# Altium schematic symbol library IC_Maxim.SchLib: 843 symbols (part 19 of 20)
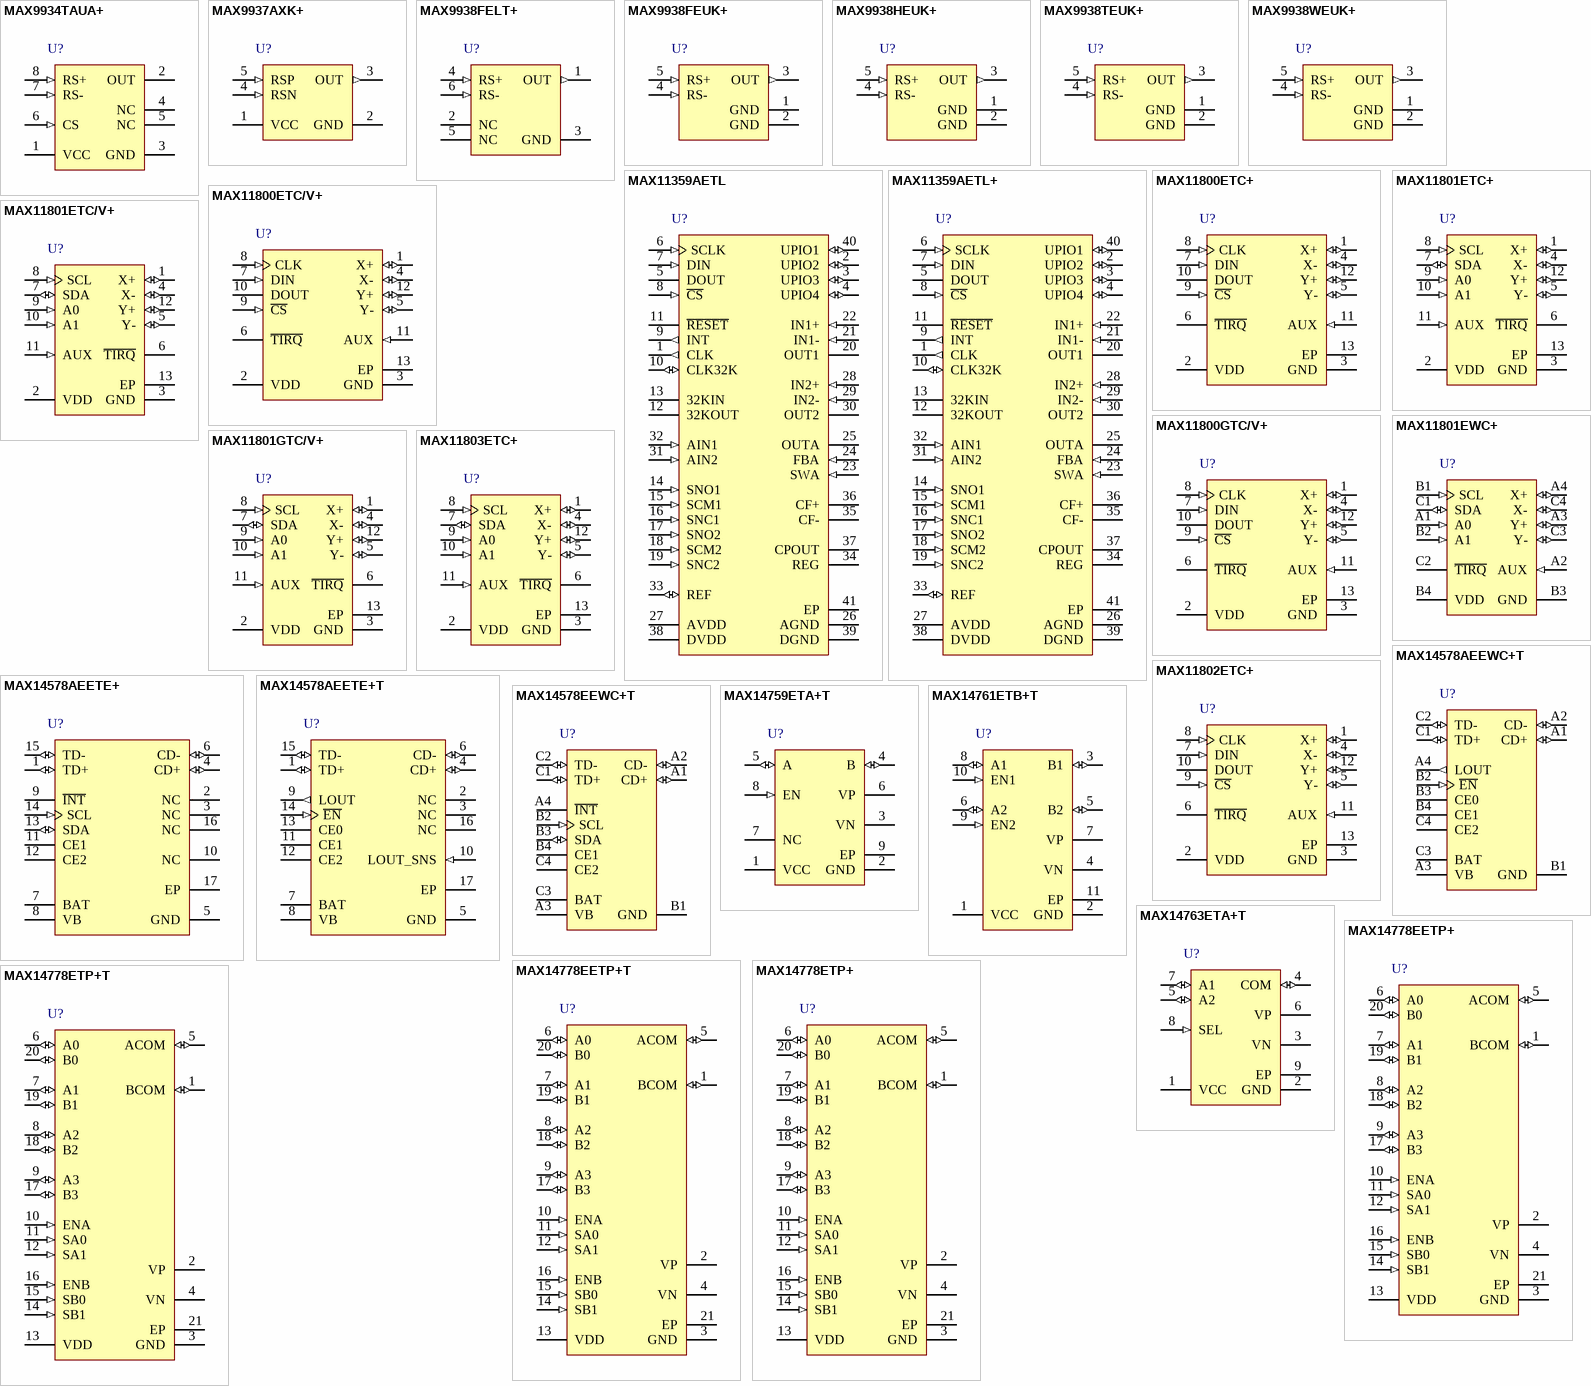
[diagram p42: symbols MAX9934TAUA+ to MAX14778ETP+T]

## MAX11801EWC+
designator U?
4 Channels, Ultra-Small, Low-Power, 4-Wire Touch-Sensor Controller with I2C Interface, -40 to 85 degC, 12-Pin BGA (W121A2+1), Pb-Free; Generic Part Number: MAX11801; PartNumber: MAX11801EWC+; Channels: 4; Controller Type: Resistive; EV Kit: Yes; DatasheetVersion: Rev. 3; PackageVersion: Rev. G, 02/2010; PackageReference: W121A2+1; PackageDescription: 12-Pin Wafer-Level Package, Full Array, Body 1.555 x 2.135 mm, Pitch 0.5 mm; Interface: I2C; Mounting Technology: Surface Mount; ComponentLink1Description: Manufacturer URL; ComponentLink1URL: http://www.maximintegrated.com/; ComponentLink2Description: Datasheet; ComponentLink2URL: http://datasheets.maximintegrated.com/en/ds/MAX11800-MAX11803.pdf; ComponentLink3Description: Package Specification; ComponentLink3URL: http://pdfserv.maximintegrated.com/package_dwgs/21-0009.PDF
footprint BGA12_0.5(2X1.5)-A (Footprint not found)
pins: A1 A0 (in) "I2C Address Input Bit 0", A2 AUX (in) "Auxiliary Input", A3 Y+ (io) "Y+ Channel Input/Output", A4 X+ (io) "X+ Channel Input/Output", B1 SCL (in) "I2C Serial Data Clock Input", B2 A1 (in) "I2C Address Input Bit 1", B3 GND (power) "Ground", B4 VDD (power) "Power Supply. Bypass VDD to GND with a 1uF capacitor.", C1 SDA (io) "I2C Serial Data Bus Input/Output", C2 ~{TIRQ} (hiz) "Active-Low Touch Interrupt Output", C3 Y- (io) "Y- Channel Input/Output", C4 X- (io) "X- Channel Input/Output"

## MAX11801GTC/V+
designator U?
4 Channels, Ultra-Small, Low-Power, 4-Wire Touch-Sensor Controller with I2C Interface, -40 to 105 degC, 12-Pin QFN (T1244+4), Pb-Free; Generic Part Number: MAX11801; PartNumber: MAX11801GTC/V+; Channels: 4; Controller Type: Resistive; EV Kit: Yes; DatasheetVersion: Rev. 3; PackageVersion: Rev. L, 04/2012; PackageReference: T1244+4; PackageDescription: 12-Pin Thin Quad Flatpack, No Leads, Body 4 x 4 mm, Pitch 0.8 mm; Supplier Part Number 1: MAX11801GTC/V+-ND; Supplier Part Number 2: 700-MAX11801GTC/V+; Interface: I2C; Mounting Technology: Surface Mount; Code_JEDEC: MO-220; ComponentLink1Description: Manufacturer URL; ComponentLink1URL: http://www.maximintegrated.com/; ComponentLink2Description: Datasheet; ComponentLink2URL: http://datasheets.maximintegrated.com/en/ds/MAX11800-MAX11803.pdf; ComponentLink3Description: Package Specification; ComponentLink3URL: http://pdfserv.maximintegrated.com/package_dwgs/21-0139.PDF
footprint QFN12_0.8-PAD(4X4) (Footprint not found)
pins: 1 X+ (io) "X+ Channel Input/Output", 2 VDD (power) "Power Supply. Bypass VDD to GND with a 1uF capacitor.", 3 GND (power) "Ground", 4 X- (io) "X- Channel Input/Output", 5 Y- (io) "Y- Channel Input/Output", 6 ~{TIRQ} (hiz) "Active-Low Touch Interrupt Output", 7 SDA (io) "I2C Serial Data Bus Input/Output", 8 SCL (in) "I2C Serial Data Clock Input", 9 A0 (in) "I2C Address Input Bit 0", 10 A1 (in) "I2C Address Input Bit 1", 11 AUX (in) "Auxiliary Input", 12 Y+ (io) "Y+ Channel Input/Output", 13 EP (power) "Exposed Pad (TQFN only). Connected to ground."

## MAX11802ETC+
designator U?
4 Channels, Low-Power, Ultra Small Resistive Touch-Screen Controller with SPI Interface, -40 to 85 degC, 12-Pin QFN (T1244+4), Pb-Free; Generic Part Number: MAX11802; PartNumber: MAX11802ETC+; Channels: 4; EV Kit: Yes; DatasheetVersion: Rev. 3; PackageVersion: Rev. L, 04/2012; PackageReference: T1244+4; PackageDescription: 12-Pin Thin Quad Flatpack, No Leads, Body 4 x 4 mm, Pitch 0.8 mm; Supplier Part Number 1: MAX11802ETC+-ND; Supplier Part Number 2: 2071378; Supplier Part Number 3: 27R0848; Supplier Part Number 4: 700-MAX11802ETC+; Controller Type: Resistive; Interface: SPI; Mounting Technology: Surface Mount; Code_JEDEC: MO-220; ComponentLink1Description: Manufacturer URL; ComponentLink1URL: http://www.maximintegrated.com/; ComponentLink2Description: Datasheet; ComponentLink2URL: http://datasheets.maximintegrated.com/en/ds/MAX11800-MAX11803.pdf; ComponentLink3Description: Package Specification; ComponentLink3URL: http://pdfserv.maximintegrated.com/package_dwgs/21-0139.PDF
footprint QFN12_0.8-PAD(4X4) (Footprint not found)
pins: 1 X+ (io) "X+ Channel Input/Output", 2 VDD (power) "Power Supply. Bypass VDD to GND with a 1uF capacitor.", 3 GND (power) "Ground", 4 X- (io) "X- Channel Input/Output", 5 Y- (io) "Y- Channel Input/Output", 6 ~{TIRQ} (hiz) "Active-Low Touch Interrupt Output", 7 DIN (in) "SPI Serial Data Input", 8 CLK (in) "SPI Serial Data Clock Input", 9 ~{CS} (in) "SPI Chip-Select Input", 10 DOUT (hiz) "SPI Data Output", 11 AUX (in) "Auxiliary Input", 12 Y+ (io) "Y+ Channel Input/Output", 13 EP (power) "Exposed Pad (TQFN only). Connected to ground."

## MAX11803ETC+
designator U?
4 Channels, Low-Power, Ultra Small Resistive Touch-Screen Controller with SPI Interface, -40 to 85 degC, 12-Pin QFN (T1244+4), Pb-Free; Generic Part Number: MAX11803; PartNumber: MAX11803ETC+; Channels: 4; EV Kit: Yes; Interface: I2C; DatasheetVersion: Rev. 3; PackageVersion: Rev. L, 04/2012; PackageReference: T1244+4; PackageDescription: 12-Pin Thin Quad Flatpack, No Leads, Body 4 x 4 mm, Pitch 0.8 mm; Supplier Part Number 1: MAX11803ETC+-ND; Supplier Part Number 2: 2071379; Supplier Part Number 3: 27R0851; Supplier Part Number 4: 700-MAX11803ETC+; Controller Type: Resistive; Mounting Technology: Surface Mount; Code_JEDEC: MO-220; ComponentLink1Description: Manufacturer URL; ComponentLink1URL: http://www.maximintegrated.com/; ComponentLink2Description: Datasheet; ComponentLink2URL: http://datasheets.maximintegrated.com/en/ds/MAX11800-MAX11803.pdf; ComponentLink3Description: Package Specification; ComponentLink3URL: http://pdfserv.maximintegrated.com/package_dwgs/21-0139.PDF
footprint QFN12_0.8-PAD(4X4) (Footprint not found)
pins: 1 X+ (io) "X+ Channel Input/Output", 2 VDD (power) "Power Supply. Bypass VDD to GND with a 1uF capacitor.", 3 GND (power) "Ground", 4 X- (io) "X- Channel Input/Output", 5 Y- (io) "Y- Channel Input/Output", 6 ~{TIRQ} (hiz) "Active-Low Touch Interrupt Output", 7 SDA (io) "I2C Serial Data Bus Input/Output", 8 SCL (in) "I2C Serial Data Clock Input", 9 A0 (in) "I2C Address Input Bit 0", 10 A1 (in) "I2C Address Input Bit 1", 11 AUX (in) "Auxiliary Input", 12 Y+ (io) "Y+ Channel Input/Output", 13 EP (power) "Exposed Pad (TQFN only). Connected to ground."

## MAX14578AEETE+
designator U?
USB Device Charger Detector, 16-Pin TQFN, -40癈 to +85癈, Pb-Free; DatasheetVersion: Rev 1, Feb-2012; PackageVersion: revJ, 2010; PackageReference: T1633+5; PackageDescription: 16-Pin Thin Quad Flatpack, No Leads, 3 x 3 x 0.75 mm Body, 0.5 mm Pitch, TQFN, Pb-Free; Code_JEDEC: MO-220WEED-2; ComponentLink1Description: Manufacturer URL; ComponentLink1URL: http://www.maxim-ic.com; ComponentLink2Description: Datasheet; ComponentLink2URL: http://datasheets.maxim-ic.com/en/ds/MAX14578AE-MAX14578E.pdf; ComponentLink3Description: Package Specification; ComponentLink3URL: http://pdfserv.maxim-ic.com/package_dwgs/21-0136.PDF
footprint QFN16_0.5-PAD(3X3) (Footprint not found)
pins: 1 TD+ (io), 2 NC, 3 NC, 4 CD+ (io), 5 GND (power), 6 CD- (io), 7 BAT (power), 8 VB (power), 9 ~{INT} (oc), 10 NC, 11 CE1 (oc), 12 CE2 (oc), 13 SDA (io), 14 SCL (in), 15 TD- (io), 16 NC, 17 EP (power)

## MAX14578AEETE+T
designator U?
USB Device Charger Detector, 16-Pin TQFN, -40癈 to +85癈, Pb-Free, Tape and Reel; DatasheetVersion: Rev 1, Feb-2012; PackageVersion: revJ, 2010; PackageReference: T1633+5; PackageDescription: 16-Pin Thin Quad Flatpack, No Leads, 3 x 3 x 0.75 mm Body, 0.5 mm Pitch, TQFN, Pb-Free; Code_JEDEC: MO-220WEED-2; ComponentLink1Description: Manufacturer URL; ComponentLink1URL: http://www.maxim-ic.com; ComponentLink2Description: Datasheet; ComponentLink2URL: http://datasheets.maxim-ic.com/en/ds/MAX14578AE-MAX14578E.pdf; ComponentLink3Description: Package Specification; ComponentLink3URL: http://pdfserv.maxim-ic.com/package_dwgs/21-0136.PDF
footprint QFN16_0.5-PAD(3X3) (Footprint not found)
pins: 1 TD+ (io), 2 NC, 3 NC, 4 CD+ (io), 5 GND (power), 6 CD- (io), 7 BAT (power), 8 VB (power), 9 LOUT (out), 10 LOUT_SNS (in), 11 CE1 (oc), 12 CE2 (oc), 13 CE0 (oc), 14 ~{EN} (in), 15 TD- (io), 16 NC, 17 EP (power)

## MAX14578AEEWC+T
designator U?
USB Device Charger Detector, 12-Pin WLP, -40癈 to +85癈, Pb-Free, Tape and Reel; DatasheetVersion: Rev 1, Feb-2012; PackageVersion: revC, Apr-2010; PackageReference: W121A1+1; PackageDescription: 12-Bump Wafer-Level Package (WLP) 3x4 Bump, Full Array, 0.4 mm Pitch, Pb-Free; ComponentLink1Description: Manufacturer URL; ComponentLink1URL: http://www.maxim-ic.com; ComponentLink2Description: Datasheet; ComponentLink2URL: http://datasheets.maxim-ic.com/en/ds/MAX14578AE-MAX14578E.pdf; ComponentLink3Description: Package Specification; ComponentLink3URL: http://pdfserv.maxim-ic.com/package_dwgs/21-0449.PDF
footprint BGA12_0.4(2X1.3)-A (Footprint not found)
pins: A1 CD+ (io), A2 CD- (io), A3 VB (power), A4 LOUT (out), B1 GND (power), B2 ~{EN} (in), B3 CE0 (oc), B4 CE1 (oc), C1 TD+ (io), C2 TD- (io), C3 BAT (power), C4 CE2 (oc)

## MAX14578EEWC+T
designator U?
USB Device Charger Detector, 12-Pin WLP, -40癈 to +85癈, Pb-Free, Tape and Reel; DatasheetVersion: Rev 1, Feb-2012; PackageVersion: revC, Apr-2010; PackageReference: W121A1+1; PackageDescription: 12-Bump Wafer-Level Package (WLP) 3x4 Bump, Full Array, 0.4 mm Pitch, Pb-Free; ComponentLink1Description: Manufacturer URL; ComponentLink1URL: http://www.maxim-ic.com; ComponentLink2Description: Datasheet; ComponentLink2URL: http://datasheets.maxim-ic.com/en/ds/MAX14578AE-MAX14578E.pdf; ComponentLink3Description: Package Specification; ComponentLink3URL: http://pdfserv.maxim-ic.com/package_dwgs/21-0449.PDF
footprint BGA12_0.4(2X1.3)-A (Footprint not found)
pins: A1 CD+ (io), A2 CD- (io), A3 VB (power), A4 ~{INT} (oc), B1 GND (power), B2 SCL (in), B3 SDA (io), B4 CE1 (oc), C1 TD+ (io), C2 TD- (io), C3 BAT (power), C4 CE2 (oc)

## MAX14759ETA+T
designator U?
Above and Below the Rails Low On-Resistance Analog Switch, Single SPST, 8-Pin TDFN-EP, -40癈 to +85癈, Pb-Free, Tape and Reel; DatasheetVersion: Rev 0, Sep-2011; PackageVersion: revJ, 2009; PackageReference: T833+2; PackageDescription: 8-Pin Plastic Very Very Thin Dual Flatpack No Leads, Exposed Pad, 3 x 3 x 0.8 mm Body, TDFN-EP, Pb-Free; Code_JEDEC: MO-229-WEEC; ComponentLink1Description: Manufacturer URL; ComponentLink1URL: http://www.maxim-ic.com; ComponentLink2Description: Datasheet; ComponentLink2URL: http://datasheets.maxim-ic.com/en/ds/MAX14759-MAX14763.pdf; ComponentLink3Description: Package Specification; ComponentLink3URL: http://pdfserv.maxim-ic.com/package_dwgs/21-0137.PDF; ComponentLink4Description: URL Link1; ComponentLink4URL: http://pdfserv.maxim-ic.com/land_patterns/90-0059.PDF
footprint DFN8_0.65-PAD(3X3) (Footprint not found)
pins: 1 VCC (power) "Positive-Supply Voltage Input. Bypass VCC to GND with a 0.1uF ceramic capacitor placed as close as possible to the device.", 2 GND (power) "Ground.", 3 VN "Negative Voltage Output. Bypass VN to GND with a 1uF ceramic capacitor placed as close as possible to the device.", 4 B (io) "Analog Switch Common Terminal.", 5 A (io) "Analog Switch Normally Open Terminal.", 6 VP "Positive Voltage Output. Bypass VP to GND with a 1uF ceramic capacitor placed as close as possible to the device.", 7 NC "No Connection. Leave unconnected.", 8 EN (in) "Switch Control Input. Drive EN high to close the switch or drive EN low to open the switch.", 9 EP "Exposed Pad. Internally connected to VN; not intended as an electrical connection. Leave exposed pad unconnected."

## MAX14761ETB+T
designator U?
Above and Below the Rails Low On-Resistance Analog Switch, Dual SPST, 10-Pin TDFN-EP, -40癈 to +85癈, Pb-Free, Tape and Reel; DatasheetVersion: Rev 0, Sep-2011; PackageVersion: revJ, 2009; PackageReference: T1033+1; PackageDescription: 10-Pin Plastic Very Very Thin Dual Flatpack No Leads, Exposed Pad, 3 x 3 x 0.8 mm Body, TDFN-EP, Pb-Free; Code_JEDEC: MO-229-WEED-3; ComponentLink1Description: Manufacturer URL; ComponentLink1URL: http://www.maxim-ic.com; ComponentLink2Description: Datasheet; ComponentLink2URL: http://datasheets.maxim-ic.com/en/ds/MAX14759-MAX14763.pdf; ComponentLink3Description: Package Specification; ComponentLink3URL: http://pdfserv.maxim-ic.com/package_dwgs/21-0137.PDF
footprint DFN10_0.5-PAD(3X3) (Footprint not found)
pins: 1 VCC (power) "Positive-Supply Voltage Input. Bypass VCC to GND with a 0.1uF ceramic capacitor placed as close as possible to the device.", 2 GND (power) "Ground.", 3 B1 (io) "Analog Switch 1 Common Terminal.", 4 VN "Negative Voltage Output. Bypass VN to GND with a 1uF ceramic capacitor placed as close as possible to the device.", 5 B2 (io) "Analog Switch 2 Common Terminal.", 6 A2 (io) "Analog Switch 2 Normally Open Terminal.", 7 VP "Positive Voltage Output. Bypass VP to GND with a 1uF ceramic capacitor placed as close as possible to the device.", 8 A1 (io) "Analog Switch 1 Normally Closed Terminal.", 9 EN2 (in) "Switch 2 Control Input. Drive EN2 high to close switch 2 or drive EN2 low to open switch 2.", 10 EN1 (in) "Switch 1 Control Input. Drive EN1 high to open switch 1 or drive EN1 low to close switch 1.", 11 EP "Exposed Pad. Internally connected to VN; not intended as an electrical connection. Leave exposed pad unconnected."

## MAX14763ETA+T
designator U?
Above and Below the Rails Low On-Resistance Analog Switch, Single SPDT, 8-Pin TDFN-EP, -40癈 to +85癈, Pb-Free, Tape and Reel; DatasheetVersion: Rev 0, Sep-2011; PackageVersion: revJ, 2009; PackageReference: T833+2; PackageDescription: 8-Pin Plastic Very Very Thin Dual Flatpack No Leads, Exposed Pad, 3 x 3 x 0.8 mm Body, TDFN-EP, Pb-Free; Code_JEDEC: MO-229-WEEC; ComponentLink1Description: Manufacturer URL; ComponentLink1URL: http://www.maxim-ic.com; ComponentLink2Description: Datasheet; ComponentLink2URL: http://datasheets.maxim-ic.com/en/ds/MAX14759-MAX14763.pdf; ComponentLink3Description: Package Specification; ComponentLink3URL: http://pdfserv.maxim-ic.com/package_dwgs/21-0137.PDF; ComponentLink4Description: URL Link1; ComponentLink4URL: http://pdfserv.maxim-ic.com/land_patterns/90-0059.PDF
footprint DFN8_0.65-PAD(3X3) (Footprint not found)
pins: 1 VCC (power) "Positive-Supply Voltage Input. Bypass VCC to GND with a 0.1uF ceramic capacitor placed as close as possible to the device.", 2 GND (power) "Ground.", 3 VN "Negative Voltage Output. Bypass VN to GND with a 1uF ceramic capacitor placed as close as possible to the device.", 4 COM (io) "Analog Switch Common Terminal.", 5 A2 (io) "Analog Switch 2 Normally Open Terminal.", 6 VP "Positive Voltage Output. Bypass VP to GND with a 1uF ceramic capacitor placed as close as possible to the device.", 7 A1 (io) "Analog Switch 1 Normally Closed Terminal.", 8 SEL (in) "Switch Control Input. Drive SEL low to connect the COM terminal to A1 or drive SEL high to connect the COM terminal to A2.", 9 EP "Exposed Pad. Internally connected to VN; not intended as an electrical connection. Leave exposed pad unconnected."

## MAX14778EETP+
designator U?
Dual +/-25V Above and Below the Rails 4:1 Analog Multiplexer, 20-Pin TQFN, -40癈 to +85癈, Pb-Free; DatasheetVersion: Rev 0, Jun-2011; PackageVersion: revO, 2011; PackageReference: T2055+4; PackageDescription: 20-Pin Thin Quad Flatpack, No Leads, 5 x 5 x 0.75 mm Body, 0.65 mm Pitch, TQFN, Pb-Free; Code_JEDEC: MO-220WHHC; ComponentLink1Description: Manufacturer URL; ComponentLink1URL: http://www.maxim-ic.com; ComponentLink2Description: Datasheet; ComponentLink2URL: http://datasheets.maxim-ic.com/en/ds/MAX14778.pdf; ComponentLink3Description: Package Specification; ComponentLink3URL: http://pdfserv.maxim-ic.com/package_dwgs/21-0140.PDF
footprint QFN20_0.65-PAD(5X5) (Footprint not found)
pins: 1 BCOM (io) "MUX B Common Terminal.", 2 VP "Positive Charge-Pump Output. Bypass VP to GND with a 1uF ceramic capacitor (35V or higher).", 3 GND (power) "Ground.", 4 VN "Negative Charge-Pump Output. Bypass VN to GND with a 1uF ceramic capacitor (30V or higher).", 5 ACOM (io) "MUX A Common Terminal.", 6 A0 (io) "MUX A Bidirectional Analog Input/Output 0.", 7 A1 (io) "MUX A Bidirectional Analog Input/Output 1.", 8 A2 (io) "MUX A Bidirectional Analog Input/Output 2.", 9 A3 (io) "MUX A Bidirectional Analog Input/Output 3.", 10 ENA (in) "MUX A Enable Input.", 11 SA0 (in) "MUX A Channel Select Input 0.", 12 SA1 (in) "MUX A Channel Select Input 1.", 13 VDD (power) "Power-Supply Input. Bypass VDD to GND with a 1uF ceramic capacitor.", 14 SB1 (in) "MUX B Channel Select Input 1.", 15 SB0 (in) "MUX B Channel Select Input 0.", 16 ENB (in) "MUX B Enable Input.", 17 B3 (io) "MUX B Bidirectional Analog Input/Output 3.", 18 B2 (io) "MUX B Bidirectional Analog Input/Output 2.", 19 B1 (io) "MUX B Bidirectional Analog Input/Output 1.", 20 B0 (io) "MUX B Bidirectional Analog Input/Output 0.", 21 EP "Exposed Pad. Connect EP to VN. EP is not intended as an electrical connection point."

## MAX14778EETP+T
designator U?
Dual +/-25V Above and Below the Rails 4:1 Analog Multiplexer, 20-Pin TQFN, -40癈 to +85癈, Pb-Free, Tape and Reel; DatasheetVersion: Rev 0, Jun-2011; PackageVersion: revO, 2011; PackageReference: T2055+4; PackageDescription: 20-Pin Thin Quad Flatpack, No Leads, 5 x 5 x 0.75 mm Body, 0.65 mm Pitch, TQFN, Pb-Free; Code_JEDEC: MO-220WHHC; ComponentLink1Description: Manufacturer URL; ComponentLink1URL: http://www.maxim-ic.com; ComponentLink2Description: Datasheet; ComponentLink2URL: http://datasheets.maxim-ic.com/en/ds/MAX14778.pdf; ComponentLink3Description: Package Specification; ComponentLink3URL: http://pdfserv.maxim-ic.com/package_dwgs/21-0140.PDF
footprint QFN20_0.65-PAD(5X5) (Footprint not found)
pins: 1 BCOM (io) "MUX B Common Terminal.", 2 VP "Positive Charge-Pump Output. Bypass VP to GND with a 1uF ceramic capacitor (35V or higher).", 3 GND (power) "Ground.", 4 VN "Negative Charge-Pump Output. Bypass VN to GND with a 1uF ceramic capacitor (30V or higher).", 5 ACOM (io) "MUX A Common Terminal.", 6 A0 (io) "MUX A Bidirectional Analog Input/Output 0.", 7 A1 (io) "MUX A Bidirectional Analog Input/Output 1.", 8 A2 (io) "MUX A Bidirectional Analog Input/Output 2.", 9 A3 (io) "MUX A Bidirectional Analog Input/Output 3.", 10 ENA (in) "MUX A Enable Input.", 11 SA0 (in) "MUX A Channel Select Input 0.", 12 SA1 (in) "MUX A Channel Select Input 1.", 13 VDD (power) "Power-Supply Input. Bypass VDD to GND with a 1uF ceramic capacitor.", 14 SB1 (in) "MUX B Channel Select Input 1.", 15 SB0 (in) "MUX B Channel Select Input 0.", 16 ENB (in) "MUX B Enable Input.", 17 B3 (io) "MUX B Bidirectional Analog Input/Output 3.", 18 B2 (io) "MUX B Bidirectional Analog Input/Output 2.", 19 B1 (io) "MUX B Bidirectional Analog Input/Output 1.", 20 B0 (io) "MUX B Bidirectional Analog Input/Output 0.", 21 EP "Exposed Pad. Connect EP to VN. EP is not intended as an electrical connection point."

## MAX14778ETP+
designator U?
Dual +/-25V Above and Below the Rails 4:1 Analog Multiplexer, 20-Pin TQFN, -40癈 to +85癈, Pb-Free; DatasheetVersion: Rev 0, Jun-2011; PackageVersion: revO, 2011; PackageReference: T2055+4; PackageDescription: 20-Pin Thin Quad Flatpack, No Leads, 5 x 5 x 0.75 mm Body, 0.65 mm Pitch, TQFN, Pb-Free; Code_JEDEC: MO-220WHHC; ComponentLink1Description: Manufacturer URL; ComponentLink1URL: http://www.maxim-ic.com; ComponentLink2Description: Datasheet; ComponentLink2URL: http://datasheets.maxim-ic.com/en/ds/MAX14778.pdf; ComponentLink3Description: Package Specification; ComponentLink3URL: http://pdfserv.maxim-ic.com/package_dwgs/21-0140.PDF
footprint QFN20_0.65-PAD(5X5) (Footprint not found)
pins: 1 BCOM (io) "MUX B Common Terminal.", 2 VP "Positive Charge-Pump Output. Bypass VP to GND with a 1uF ceramic capacitor (35V or higher).", 3 GND (power) "Ground.", 4 VN "Negative Charge-Pump Output. Bypass VN to GND with a 1uF ceramic capacitor (30V or higher).", 5 ACOM (io) "MUX A Common Terminal.", 6 A0 (io) "MUX A Bidirectional Analog Input/Output 0.", 7 A1 (io) "MUX A Bidirectional Analog Input/Output 1.", 8 A2 (io) "MUX A Bidirectional Analog Input/Output 2.", 9 A3 (io) "MUX A Bidirectional Analog Input/Output 3.", 10 ENA (in) "MUX A Enable Input.", 11 SA0 (in) "MUX A Channel Select Input 0.", 12 SA1 (in) "MUX A Channel Select Input 1.", 13 VDD (power) "Power-Supply Input. Bypass VDD to GND with a 1uF ceramic capacitor.", 14 SB1 (in) "MUX B Channel Select Input 1.", 15 SB0 (in) "MUX B Channel Select Input 0.", 16 ENB (in) "MUX B Enable Input.", 17 B3 (io) "MUX B Bidirectional Analog Input/Output 3.", 18 B2 (io) "MUX B Bidirectional Analog Input/Output 2.", 19 B1 (io) "MUX B Bidirectional Analog Input/Output 1.", 20 B0 (io) "MUX B Bidirectional Analog Input/Output 0.", 21 EP "Exposed Pad. Connect EP to VN. EP is not intended as an electrical connection point."

## MAX14778ETP+T
designator U?
Dual +/-25V Above and Below the Rails 4:1 Analog Multiplexer, 20-Pin TQFN, -40癈 to +85癈, Pb-Free, Tape and Reel; DatasheetVersion: Rev 0, Jun-2011; PackageVersion: revO, 2011; PackageReference: T2055+4; PackageDescription: 20-Pin Thin Quad Flatpack, No Leads, 5 x 5 x 0.75 mm Body, 0.65 mm Pitch, TQFN, Pb-Free; Code_JEDEC: MO-220WHHC; ComponentLink1Description: Manufacturer URL; ComponentLink1URL: http://www.maxim-ic.com; ComponentLink2Description: Datasheet; ComponentLink2URL: http://datasheets.maxim-ic.com/en/ds/MAX14778.pdf; ComponentLink3Description: Package Specification; ComponentLink3URL: http://pdfserv.maxim-ic.com/package_dwgs/21-0140.PDF
footprint QFN20_0.65-PAD(5X5) (Footprint not found)
pins: 1 BCOM (io) "MUX B Common Terminal.", 2 VP "Positive Charge-Pump Output. Bypass VP to GND with a 1uF ceramic capacitor (35V or higher).", 3 GND (power) "Ground.", 4 VN "Negative Charge-Pump Output. Bypass VN to GND with a 1uF ceramic capacitor (30V or higher).", 5 ACOM (io) "MUX A Common Terminal.", 6 A0 (io) "MUX A Bidirectional Analog Input/Output 0.", 7 A1 (io) "MUX A Bidirectional Analog Input/Output 1.", 8 A2 (io) "MUX A Bidirectional Analog Input/Output 2.", 9 A3 (io) "MUX A Bidirectional Analog Input/Output 3.", 10 ENA (in) "MUX A Enable Input.", 11 SA0 (in) "MUX A Channel Select Input 0.", 12 SA1 (in) "MUX A Channel Select Input 1.", 13 VDD (power) "Power-Supply Input. Bypass VDD to GND with a 1uF ceramic capacitor.", 14 SB1 (in) "MUX B Channel Select Input 1.", 15 SB0 (in) "MUX B Channel Select Input 0.", 16 ENB (in) "MUX B Enable Input.", 17 B3 (io) "MUX B Bidirectional Analog Input/Output 3.", 18 B2 (io) "MUX B Bidirectional Analog Input/Output 2.", 19 B1 (io) "MUX B Bidirectional Analog Input/Output 1.", 20 B0 (io) "MUX B Bidirectional Analog Input/Output 0.", 21 EP "Exposed Pad. Connect EP to VN. EP is not intended as an electrical connection point."

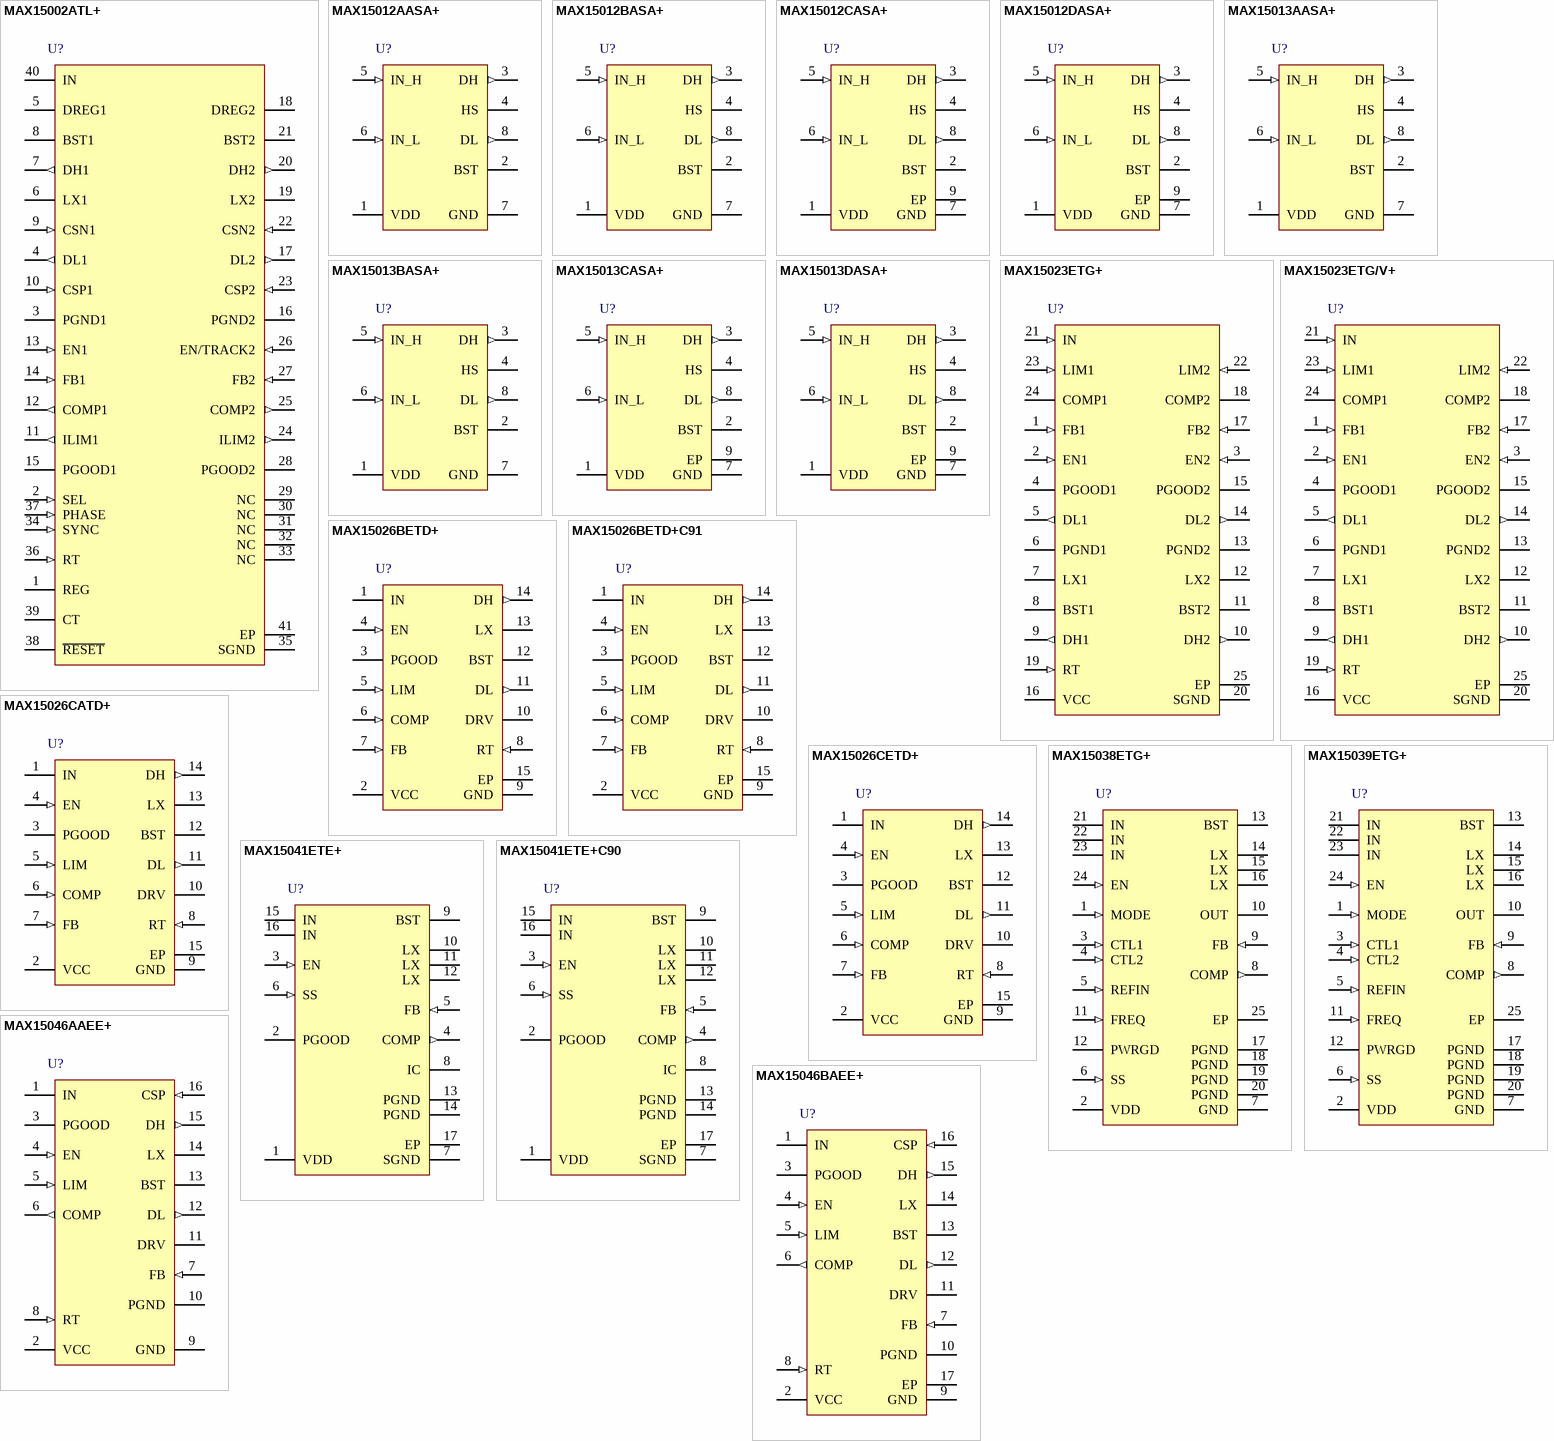
[diagram p22: symbols MAX15002ATL+ to MAX15046BAEE+]

## MAX15002ATL+
designator U?
Dual-Output Buck Controller with Tracking/Sequencing, 40-Pin TQFN, -40癈 to +125癈, Pb-Free; DatasheetVersion: Rev 1, Jun-2008; PackageVersion: revK, 2010; PackageReference: T4066+3; PackageDescription: 40-Pin Thin Quad Flatpack, No Leads, 6 x 6 x 0.75 mm Body, 0.5 mm Pitch, TQFN, Pb-Free; Code_JEDEC: MO-220-WJJD-2; ComponentLink1Description: Manufacturer URL; ComponentLink1URL: http://www.maxim-ic.com; ComponentLink2Description: Datasheet; ComponentLink2URL: http://datasheets.maxim-ic.com/en/ds/MAX15002.pdf; ComponentLink3Description: Package Specification; ComponentLink3URL: http://pdfserv.maxim-ic.com/package_dwgs/21-0141.PDF
footprint QFN40_0.5-PAD(6X6) (Footprint not found)
pins: 1 REG (power), 2 SEL (in), 3 PGND1 (power), 4 DL1 (out), 5 DREG1 (power), 6 LX1, 7 DH1 (out), 8 BST1, 9 CSN1 (in), 10 CSP1 (in), 11 ILIM1 (out), 12 COMP1 (out), 13 EN1 (in), 14 FB1 (in), 15 PGOOD1 (oc), 16 PGND2 (power), 17 DL2 (out), 18 DREG2 (power), 19 LX2, 20 DH2 (out), 21 BST2, 22 CSN2 (in), 23 CSP2 (in), 24 ILIM2 (out), 25 COMP2 (out), 26 EN/TRACK2 (in), 27 FB2 (in), 28 PGOOD2 (oc), 29 NC, 30 NC, 31 NC, 32 NC, 33 NC, 34 SYNC (in), 35 SGND (power), 36 RT (in), 37 PHASE (in), 38 ~{RESET} (oc), 39 CT, 40 IN (power), 41 EP (power)

## MAX15012AASA+
designator U?
175V/2A, High-Speed, Half-Bridge MOSFET Driver, non-inverting low-side driver, 8-Pin SOIC, -40癈 to +125癈, Pb-Free; DatasheetVersion: Rev 1, Dec-2007; PackageVersion: revC, 2010; PackageReference: S8+5; PackageDescription: 8-Pin Small-Outline IC, Narrow (0.15in), 1.27 mm Pitch, SOIC (N), Pb-Free; Code_JEDEC: MS-012-AA; Code_IPC: SOIC127P600-8; ComponentLink1Description: Manufacturer URL; ComponentLink1URL: http://www.maxim-ic.com; ComponentLink2Description: Datasheet; ComponentLink2URL: http://datasheets.maxim-ic.com/en/ds/MAX15012-MAX15013B.pdf; ComponentLink3Description: Package Specification; ComponentLink3URL: http://pdfserv.maxim-ic.com/package_dwgs/21-0041.PDF
footprint SOIC8_1.27 (Footprint not found)
pins: 1 VDD (power), 2 BST, 3 DH (out), 4 HS, 5 IN_H (in), 6 IN_L (in), 7 GND (power), 8 DL (out)

## MAX15012BASA+
designator U?
175V/2A, High-Speed, Half-Bridge MOSFET Driver, inverting low-side driver, 8-Pin SOIC, -40癈 to +125癈, Pb-Free; DatasheetVersion: Rev 1, Dec-2007; PackageVersion: revC, 2010; PackageReference: S8+5; PackageDescription: 8-Pin Small-Outline IC, Narrow (0.15in), 1.27 mm Pitch, SOIC (N), Pb-Free; Code_JEDEC: MS-012-AA; Code_IPC: SOIC127P600-8; ComponentLink1Description: Manufacturer URL; ComponentLink1URL: http://www.maxim-ic.com; ComponentLink2Description: Datasheet; ComponentLink2URL: http://datasheets.maxim-ic.com/en/ds/MAX15012-MAX15013B.pdf; ComponentLink3Description: Package Specification; ComponentLink3URL: http://pdfserv.maxim-ic.com/package_dwgs/21-0041.PDF
footprint SOIC8_1.27 (Footprint not found)
pins: 1 VDD (power), 2 BST, 3 DH (out), 4 HS, 5 IN_H (in), 6 IN_L (in), 7 GND (power), 8 DL (out)

## MAX15012CASA+
designator U?
175V/2A, High-Speed, Half-Bridge MOSFET Driver, non-inverting low-side driver, 8-Pin SOIC-EP, -40癈 to +125癈, Pb-Free; DatasheetVersion: Rev 1, Dec-2007; PackageVersion: revE, 2009; PackageReference: S8E+14; PackageDescription: 8-Pin Small-Outline IC, Narrow (0.15in), Exposed Pad, 1.27 mm Pitch, SOIC(N)-EP, Pb-Free; Code_JEDEC: MS-012*; ComponentLink1Description: Manufacturer URL; ComponentLink1URL: http://www.maxim-ic.com; ComponentLink2Description: Datasheet; ComponentLink2URL: http://datasheets.maxim-ic.com/en/ds/MAX15012-MAX15013B.pdf; ComponentLink3Description: Package Specification; ComponentLink3URL: http://pdfserv.maxim-ic.com/package_dwgs/21-0111.PDF
footprint SOIC8_1.27-PAD (Footprint not found)
pins: 1 VDD (power), 2 BST, 3 DH (out), 4 HS, 5 IN_H (in), 6 IN_L (in), 7 GND (power), 8 DL (out), 9 EP (power)

## MAX15012DASA+
designator U?
175V/2A, High-Speed, Half-Bridge MOSFET Driver, inverting low-side driver, 8-Pin SOIC-EP, -40癈 to +125癈, Pb-Free; DatasheetVersion: Rev 1, Dec-2007; PackageVersion: revE, 2009; PackageReference: S8E+14; PackageDescription: 8-Pin Small-Outline IC, Narrow (0.15in), Exposed Pad, 1.27 mm Pitch, SOIC(N)-EP, Pb-Free; Code_JEDEC: MS-012*; ComponentLink1Description: Manufacturer URL; ComponentLink1URL: http://www.maxim-ic.com; ComponentLink2Description: Datasheet; ComponentLink2URL: http://datasheets.maxim-ic.com/en/ds/MAX15012-MAX15013B.pdf; ComponentLink3Description: Package Specification; ComponentLink3URL: http://pdfserv.maxim-ic.com/package_dwgs/21-0111.PDF
footprint SOIC8_1.27-PAD (Footprint not found)
pins: 1 VDD (power), 2 BST, 3 DH (out), 4 HS, 5 IN_H (in), 6 IN_L (in), 7 GND (power), 8 DL (out), 9 EP (power)

## MAX15013AASA+
designator U?
175V/2A, High-Speed, Half-Bridge MOSFET Driver, non-inverting low-side driver, 8-Pin SOIC, -40癈 to +125癈, Pb-Free; DatasheetVersion: Rev 1, Dec-2007; PackageVersion: revC, 2010; PackageReference: S8+5; PackageDescription: 8-Pin Small-Outline IC, Narrow (0.15in), 1.27 mm Pitch, SOIC (N), Pb-Free; Code_JEDEC: MS-012-AA; Code_IPC: SOIC127P600-8; ComponentLink1Description: Manufacturer URL; ComponentLink1URL: http://www.maxim-ic.com; ComponentLink2Description: Datasheet; ComponentLink2URL: http://datasheets.maxim-ic.com/en/ds/MAX15012-MAX15013B.pdf; ComponentLink3Description: Package Specification; ComponentLink3URL: http://pdfserv.maxim-ic.com/package_dwgs/21-0041.PDF
footprint SOIC8_1.27 (Footprint not found)
pins: 1 VDD (power), 2 BST, 3 DH (out), 4 HS, 5 IN_H (in), 6 IN_L (in), 7 GND (power), 8 DL (out)

## MAX15013BASA+
designator U?
175V/2A, High-Speed, Half-Bridge MOSFET Driver, inverting low-side driver, 8-Pin SOIC, -40癈 to +125癈, Pb-Free; DatasheetVersion: Rev 1, Dec-2007; PackageVersion: revC, 2010; PackageReference: S8+5; PackageDescription: 8-Pin Small-Outline IC, Narrow (0.15in), 1.27 mm Pitch, SOIC (N), Pb-Free; Code_JEDEC: MS-012-AA; Code_IPC: SOIC127P600-8; ComponentLink1Description: Manufacturer URL; ComponentLink1URL: http://www.maxim-ic.com; ComponentLink2Description: Datasheet; ComponentLink2URL: http://datasheets.maxim-ic.com/en/ds/MAX15012-MAX15013B.pdf; ComponentLink3Description: Package Specification; ComponentLink3URL: http://pdfserv.maxim-ic.com/package_dwgs/21-0041.PDF
footprint SOIC8_1.27 (Footprint not found)
pins: 1 VDD (power), 2 BST, 3 DH (out), 4 HS, 5 IN_H (in), 6 IN_L (in), 7 GND (power), 8 DL (out)

## MAX15013CASA+
designator U?
175V/2A, High-Speed, Half-Bridge MOSFET Driver, non-inverting low-side driver, 8-Pin SOIC-EP, -40癈 to +125癈, Pb-Free; DatasheetVersion: Rev 1, Dec-2007; PackageVersion: revE, 2009; PackageReference: S8E+14; PackageDescription: 8-Pin Small-Outline IC, Narrow (0.15in), Exposed Pad, 1.27 mm Pitch, SOIC(N)-EP, Pb-Free; Code_JEDEC: MS-012*; ComponentLink1Description: Manufacturer URL; ComponentLink1URL: http://www.maxim-ic.com; ComponentLink2Description: Datasheet; ComponentLink2URL: http://datasheets.maxim-ic.com/en/ds/MAX15012-MAX15013B.pdf; ComponentLink3Description: Package Specification; ComponentLink3URL: http://pdfserv.maxim-ic.com/package_dwgs/21-0111.PDF
footprint SOIC8_1.27-PAD (Footprint not found)
pins: 1 VDD (power), 2 BST, 3 DH (out), 4 HS, 5 IN_H (in), 6 IN_L (in), 7 GND (power), 8 DL (out), 9 EP (power)

## MAX15013DASA+
designator U?
175V/2A, High-Speed, Half-Bridge MOSFET Driver, inverting low-side driver, 8-Pin SOIC-EP, -40癈 to +125癈, Pb-Free; DatasheetVersion: Rev 1, Dec-2007; PackageVersion: revE, 2009; PackageReference: S8E+14; PackageDescription: 8-Pin Small-Outline IC, Narrow (0.15in), Exposed Pad, 1.27 mm Pitch, SOIC(N)-EP, Pb-Free; Code_JEDEC: MS-012*; ComponentLink1Description: Manufacturer URL; ComponentLink1URL: http://www.maxim-ic.com; ComponentLink2Description: Datasheet; ComponentLink2URL: http://datasheets.maxim-ic.com/en/ds/MAX15012-MAX15013B.pdf; ComponentLink3Description: Package Specification; ComponentLink3URL: http://pdfserv.maxim-ic.com/package_dwgs/21-0111.PDF
footprint SOIC8_1.27-PAD (Footprint not found)
pins: 1 VDD (power), 2 BST, 3 DH (out), 4 HS, 5 IN_H (in), 6 IN_L (in), 7 GND (power), 8 DL (out), 9 EP (power)

## MAX15023ETG+
designator U?
Wide 4.5V to 28V Input, Dual-Output Synchronous Buck Controller, 24-Pin TQFN, -40癈 to +85癈, Pb-Free; DatasheetVersion: Rev 2, Mar-2011; PackageVersion: revK, 2011; PackageReference: T2444+4; PackageDescription: 24-Pin Thin Quad Flatpack, No Leads, 4 x 4 x 0.75 mm Body, 0.5 mm Pitch, TQFN, Pb-Free; ComponentLink1Description: Manufacturer URL; ComponentLink1URL: http://www.maxim-ic.com; ComponentLink2Description: Datasheet; ComponentLink2URL: http://datasheets.maxim-ic.com/en/ds/MAX15023.pdf; ComponentLink3Description: Package Specification; ComponentLink3URL: http://pdfserv.maxim-ic.com/package_dwgs/21-0139.PDF
footprint QFN24_0.5-PAD(4X4) (Footprint not found)
pins: 1 FB1 (in), 2 EN1 (in), 3 EN2 (in), 4 PGOOD1 (oc), 5 DL1 (out), 6 PGND1 (power), 7 LX1, 8 BST1, 9 DH1 (out), 10 DH2 (out), 11 BST2, 12 LX2, 13 PGND2 (power), 14 DL2 (out), 15 PGOOD2 (oc), 16 VCC (power), 17 FB2 (in), 18 COMP2, 19 RT (in), 20 SGND (power), 21 IN (in), 22 LIM2 (in), 23 LIM1 (in), 24 COMP1, 25 EP (power)

## MAX15023ETG/V+
designator U?
Wide 4.5V to 28V Input, Dual-Output Synchronous Buck Controller, 24-Pin TQFN, -40癈 to +85癈, Pb-Free; DatasheetVersion: Rev 2, Mar-2011; PackageVersion: revK, 2011; PackageReference: T2444+4; PackageDescription: 24-Pin Thin Quad Flatpack, No Leads, 4 x 4 x 0.75 mm Body, 0.5 mm Pitch, TQFN, Pb-Free; ComponentLink1Description: Manufacturer URL; ComponentLink1URL: http://www.maxim-ic.com; ComponentLink2Description: Datasheet; ComponentLink2URL: http://datasheets.maxim-ic.com/en/ds/MAX15023.pdf; ComponentLink3Description: Package Specification; ComponentLink3URL: http://pdfserv.maxim-ic.com/package_dwgs/21-0139.PDF
footprint QFN24_0.5-PAD(4X4) (Footprint not found)
pins: 1 FB1 (in), 2 EN1 (in), 3 EN2 (in), 4 PGOOD1 (oc), 5 DL1 (out), 6 PGND1 (power), 7 LX1, 8 BST1, 9 DH1 (out), 10 DH2 (out), 11 BST2, 12 LX2, 13 PGND2 (power), 14 DL2 (out), 15 PGOOD2 (oc), 16 VCC (power), 17 FB2 (in), 18 COMP2, 19 RT (in), 20 SGND (power), 21 IN (in), 22 LIM2 (in), 23 LIM1 (in), 24 COMP1, 25 EP (power)

## MAX15026BETD+
designator U?
4.5V to 28V Wide Operating Range, DC-DC Synchronous Buck Controller, 14-Pin TDFN-EP, -40癈 to +85癈, Pb-Free; DatasheetVersion: Rev 3, Apr-2011; PackageVersion: revJ, 2009; PackageReference: T1433+2; PackageDescription: 14-Pin Plastic Very Very Thin Dual Flatpack No Leads (TDFN-EP), 3 x 3 x 0.8 mm Body, 0.4 mm Pitch, Pb-Free; ComponentLink1Description: Manufacturer URL; ComponentLink1URL: http://www.maxim-ic.com; ComponentLink2Description: Datasheet; ComponentLink2URL: http://datasheets.maxim-ic.com/en/ds/MAX15026.pdf; ComponentLink3Description: Package Specification; ComponentLink3URL: http://pdfserv.maxim-ic.com/package_dwgs/21-0137.PDF
footprint DFN14_0.4-PAD(3X3) (Footprint not found)
pins: 1 IN (power), 2 VCC (power), 3 PGOOD (oc), 4 EN (in), 5 LIM (in), 6 COMP (in), 7 FB (in), 8 RT (in), 9 GND (power), 10 DRV (power), 11 DL (out), 12 BST, 13 LX, 14 DH (out), 15 EP (power)

## MAX15026BETD+C91
designator U?
4.5V to 28V Wide Operating Range, DC-DC Synchronous Buck Controller, 14-Pin TDFN-EP, -40癈 to +85癈, Pb-Free; DatasheetVersion: Rev 3, Apr-2011; PackageVersion: revJ, 2009; PackageReference: T1433+2; PackageDescription: 14-Pin Plastic Very Very Thin Dual Flatpack No Leads (TDFN-EP), 3 x 3 x 0.8 mm Body, 0.4 mm Pitch, Pb-Free; ComponentLink1Description: Manufacturer URL; ComponentLink1URL: http://www.maxim-ic.com; ComponentLink2Description: Datasheet; ComponentLink2URL: http://datasheets.maxim-ic.com/en/ds/MAX15026.pdf; ComponentLink3Description: Package Specification; ComponentLink3URL: http://pdfserv.maxim-ic.com/package_dwgs/21-0137.PDF
footprint DFN14_0.4-PAD(3X3) (Footprint not found)
pins: 1 IN (power), 2 VCC (power), 3 PGOOD (oc), 4 EN (in), 5 LIM (in), 6 COMP (in), 7 FB (in), 8 RT (in), 9 GND (power), 10 DRV (power), 11 DL (out), 12 BST, 13 LX, 14 DH (out), 15 EP (power)

## MAX15026CATD+
designator U?
4.5V to 28V Wide Operating Range, DC-DC Synchronous Buck Controller, 14-Pin TDFN-EP, -40癈 to +125癈, Pb-Free; DatasheetVersion: Rev 3, Apr-2011; PackageVersion: revJ, 2009; PackageReference: T1433+2; PackageDescription: 14-Pin Plastic Very Very Thin Dual Flatpack No Leads (TDFN-EP), 3 x 3 x 0.8 mm Body, 0.4 mm Pitch, Pb-Free; ComponentLink1Description: Manufacturer URL; ComponentLink1URL: http://www.maxim-ic.com; ComponentLink2Description: Datasheet; ComponentLink2URL: http://datasheets.maxim-ic.com/en/ds/MAX15026.pdf; ComponentLink3Description: Package Specification; ComponentLink3URL: http://pdfserv.maxim-ic.com/package_dwgs/21-0137.PDF
footprint DFN14_0.4-PAD(3X3) (Footprint not found)
pins: 1 IN (power), 2 VCC (power), 3 PGOOD (oc), 4 EN (in), 5 LIM (in), 6 COMP (in), 7 FB (in), 8 RT (in), 9 GND (power), 10 DRV (power), 11 DL (out), 12 BST, 13 LX, 14 DH (out), 15 EP (power)

## MAX15026CETD+
designator U?
4.5V to 28V Wide Operating Range, DC-DC Synchronous Buck Controller, 14-Pin TDFN-EP, -40癈 to +85癈, Pb-Free; DatasheetVersion: Rev 3, Apr-2011; PackageVersion: revJ, 2009; PackageReference: T1433+2; PackageDescription: 14-Pin Plastic Very Very Thin Dual Flatpack No Leads (TDFN-EP), 3 x 3 x 0.8 mm Body, 0.4 mm Pitch, Pb-Free; ComponentLink1Description: Manufacturer URL; ComponentLink1URL: http://www.maxim-ic.com; ComponentLink2Description: Datasheet; ComponentLink2URL: http://datasheets.maxim-ic.com/en/ds/MAX15026.pdf; ComponentLink3Description: Package Specification; ComponentLink3URL: http://pdfserv.maxim-ic.com/package_dwgs/21-0137.PDF
footprint DFN14_0.4-PAD(3X3) (Footprint not found)
pins: 1 IN (power), 2 VCC (power), 3 PGOOD (oc), 4 EN (in), 5 LIM (in), 6 COMP (in), 7 FB (in), 8 RT (in), 9 GND (power), 10 DRV (power), 11 DL (out), 12 BST, 13 LX, 14 DH (out), 15 EP (power)

## MAX15038ETG+
designator U?
4A, 2MHz Step-Down Regulator with Integrated Switches, 24-Pin TQFN, -40癈 to +85癈, Pb-Free; DatasheetVersion: Rev 3, Dec-2010; PackageVersion: revK, 2011; PackageReference: T2444+4; PackageDescription: 24-Pin Thin Quad Flatpack, No Leads, 4 x 4 x 0.75 mm Body, 0.5 mm Pitch, TQFN, Pb-Free; ComponentLink1Description: Manufacturer URL; ComponentLink1URL: http://www.maxim-ic.com; ComponentLink2Description: Datasheet; ComponentLink2URL: http://datasheets.maxim-ic.com/en/ds/MAX15038.pdf; ComponentLink3Description: Package Specification; ComponentLink3URL: http://pdfserv.maxim-ic.com/package_dwgs/21-0139.PDF
footprint QFN24_0.5-PAD(4X4) (Footprint not found)
pins: 1 MODE (in), 2 VDD (power), 3 CTL1 (in), 4 CTL2 (in), 5 REFIN (in), 6 SS (in), 7 GND (power), 8 COMP (out), 9 FB (in), 10 OUT, 11 FREQ (in), 12 PWRGD (oc), 13 BST, 14 LX, 15 LX, 16 LX, 17 PGND (power), 18 PGND (power), 19 PGND (power), 20 PGND (power), 21 IN (power), 22 IN (power), 23 IN (power), 24 EN (in), 25 EP (power)

## MAX15039ETG+
designator U?
6A, 2MHz Step-Down Regulator with Integrated Switches, 24-Pin TQFN, -40癈 to +85癈, Pb-Free; DatasheetVersion: Rev 3, Dec-2010; PackageVersion: revK, 2011; PackageReference: T2444+4; PackageDescription: 24-Pin Thin Quad Flatpack, No Leads, 4 x 4 x 0.75 mm Body, 0.5 mm Pitch, TQFN, Pb-Free; ComponentLink1Description: Manufacturer URL; ComponentLink1URL: http://www.maxim-ic.com; ComponentLink2Description: Datasheet; ComponentLink2URL: http://datasheets.maxim-ic.com/en/ds/MAX15039.pdf; ComponentLink3Description: Package Specification; ComponentLink3URL: http://pdfserv.maxim-ic.com/package_dwgs/21-0139.PDF
footprint QFN24_0.5-PAD(4X4) (Footprint not found)
pins: 1 MODE (in), 2 VDD (power), 3 CTL1 (in), 4 CTL2 (in), 5 REFIN (in), 6 SS (in), 7 GND (power), 8 COMP (out), 9 FB (in), 10 OUT, 11 FREQ (in), 12 PWRGD (oc), 13 BST, 14 LX, 15 LX, 16 LX, 17 PGND (power), 18 PGND (power), 19 PGND (power), 20 PGND (power), 21 IN (power), 22 IN (power), 23 IN (power), 24 EN (in), 25 EP (power)

## MAX15041ETE+
designator U?
Low-Cost, 3A, 4.5V to 28V Input, 350kHz, PWM Step-Down DC-DC Regulator with Internal Switches, 16-Pin TQFN, -40癈 to +85癈, Pb-Free; DatasheetVersion: Rev 3, Mar-2011; PackageVersion: revJ, 2010; PackageReference: T1633+4; PackageDescription: 16-Pin Thin Quad Flatpack, No Leads, 3 x 3 x 0.75 mm Body, 0.5 mm Pitch, TQFN, Pb-Free; Code_JEDEC: MO-220WEED-2; ComponentLink1Description: Manufacturer URL; ComponentLink1URL: http://www.maxim-ic.com; ComponentLink2Description: Datasheet; ComponentLink2URL: http://datasheets.maxim-ic.com/en/ds/MAX15041.pdf; ComponentLink3Description: Package Specification; ComponentLink3URL: http://pdfserv.maxim-ic.com/package_dwgs/21-0136.PDF
footprint QFN16_0.5-PAD(3X3) (Footprint not found)
pins: 1 VDD (power), 2 PGOOD (oc), 3 EN (in), 4 COMP (out), 5 FB (in), 6 SS (in), 7 SGND (power), 8 IC (power), 9 BST, 10 LX, 11 LX, 12 LX, 13 PGND (power), 14 PGND (power), 15 IN (power), 16 IN (power), 17 EP (power)

## MAX15041ETE+C90
designator U?
Custom Low-Cost, 3A, 4.5V to 28V Input, 350kHz, PWM Step-Down DC-DC Regulator with Internal Switches, 16-Pin TQFN, -40癈 to +85癈, Pb-Free, Tape and Reel; DatasheetVersion: Rev 3, Mar-2011; PackageVersion: revJ, 2010; PackageReference: T1633+4; PackageDescription: 16-Pin Thin Quad Flatpack, No Leads, 3 x 3 x 0.75 mm Body, 0.5 mm Pitch, TQFN, Pb-Free; Code_JEDEC: MO-220WEED-2; ComponentLink1Description: Manufacturer URL; ComponentLink1URL: http://www.maxim-ic.com; ComponentLink2Description: Datasheet; ComponentLink2URL: http://datasheets.maxim-ic.com/en/ds/MAX15041.pdf; ComponentLink3Description: Package Specification; ComponentLink3URL: http://pdfserv.maxim-ic.com/package_dwgs/21-0136.PDF
footprint QFN16_0.5-PAD(3X3) (Footprint not found)
pins: 1 VDD (power), 2 PGOOD (oc), 3 EN (in), 4 COMP (out), 5 FB (in), 6 SS (in), 7 SGND (power), 8 IC (power), 9 BST, 10 LX, 11 LX, 12 LX, 13 PGND (power), 14 PGND (power), 15 IN (power), 16 IN (power), 17 EP (power)

## MAX15046AAEE+
designator U?
40V, High-Performance, Synchronous Buck Controller, 16-Pin QSOP, -40癈 to +125癈, Pb-Free; DatasheetVersion: Rev 1, Feb-2010; PackageVersion: revJ, 2009; PackageReference: E16+4; PackageDescription: 16-Pin Quarter Small-Outline Package (QSOP) 0.150" Width, 0.025" Pitch, Pb-Free; Code_JEDEC: MO-137-AB; ComponentLink1Description: Manufacturer URL; ComponentLink1URL: http://www.maxim-ic.com; ComponentLink2Description: Datasheet; ComponentLink2URL: http://datasheets.maxim-ic.com/en/ds/MAX15046-MAX15046B.pdf; ComponentLink3Description: Package Specification; ComponentLink3URL: http://pdfserv.maxim-ic.com/package_dwgs/21-0055.PDF
footprint SSOP16_0.635 (Footprint not found)
pins: 1 IN (power), 2 VCC (power), 3 PGOOD (oc), 4 EN (in), 5 LIM (in), 6 COMP (out), 7 FB (in), 8 RT (in), 9 GND (power), 10 PGND (power), 11 DRV (power), 12 DL (out), 13 BST, 14 LX, 15 DH (out), 16 CSP (in)

## MAX15046BAEE+
designator U?
40V, High-Performance, Synchronous Buck Controller, 16-Pin QSOP-EP, -40癈 to +125癈, Pb-Free; DatasheetVersion: Rev 1, Feb-2010; PackageVersion: revH, 2010; PackageReference: E16E+9; PackageDescription: 16-Pin Quarter Small-Outline Package, Exposed Pad, (QSOP-EP) 0.150" Width, 0.635 mm Pitch, Pb-Free; ComponentLink1Description: Manufacturer URL; ComponentLink1URL: http://www.maxim-ic.com; ComponentLink2Description: Datasheet; ComponentLink2URL: http://datasheets.maxim-ic.com/en/ds/MAX15046-MAX15046B.pdf; ComponentLink3Description: Package Specification; ComponentLink3URL: http://pdfserv.maxim-ic.com/package_dwgs/21-0112.PDF
footprint SSOP16_0.635-PAD (Footprint not found)
pins: 1 IN (power), 2 VCC (power), 3 PGOOD (oc), 4 EN (in), 5 LIM (in), 6 COMP (out), 7 FB (in), 8 RT (in), 9 GND (power), 10 PGND (power), 11 DRV (power), 12 DL (out), 13 BST, 14 LX, 15 DH (out), 16 CSP (in), 17 EP (power)
